# Altium footprint library MEBot.PcbLib: 161 footprints (part 6 of 11)
Each footprint in its own frame and in the unit in brackets; x right, y up, seen from the top. Pads: shape width x height; smd on the part's side, far side on the other; paste and mask are expansions set on the pad; w line width, h text height; cw(c..) or ccw(c..) is an arc to the next point about the centre after c.
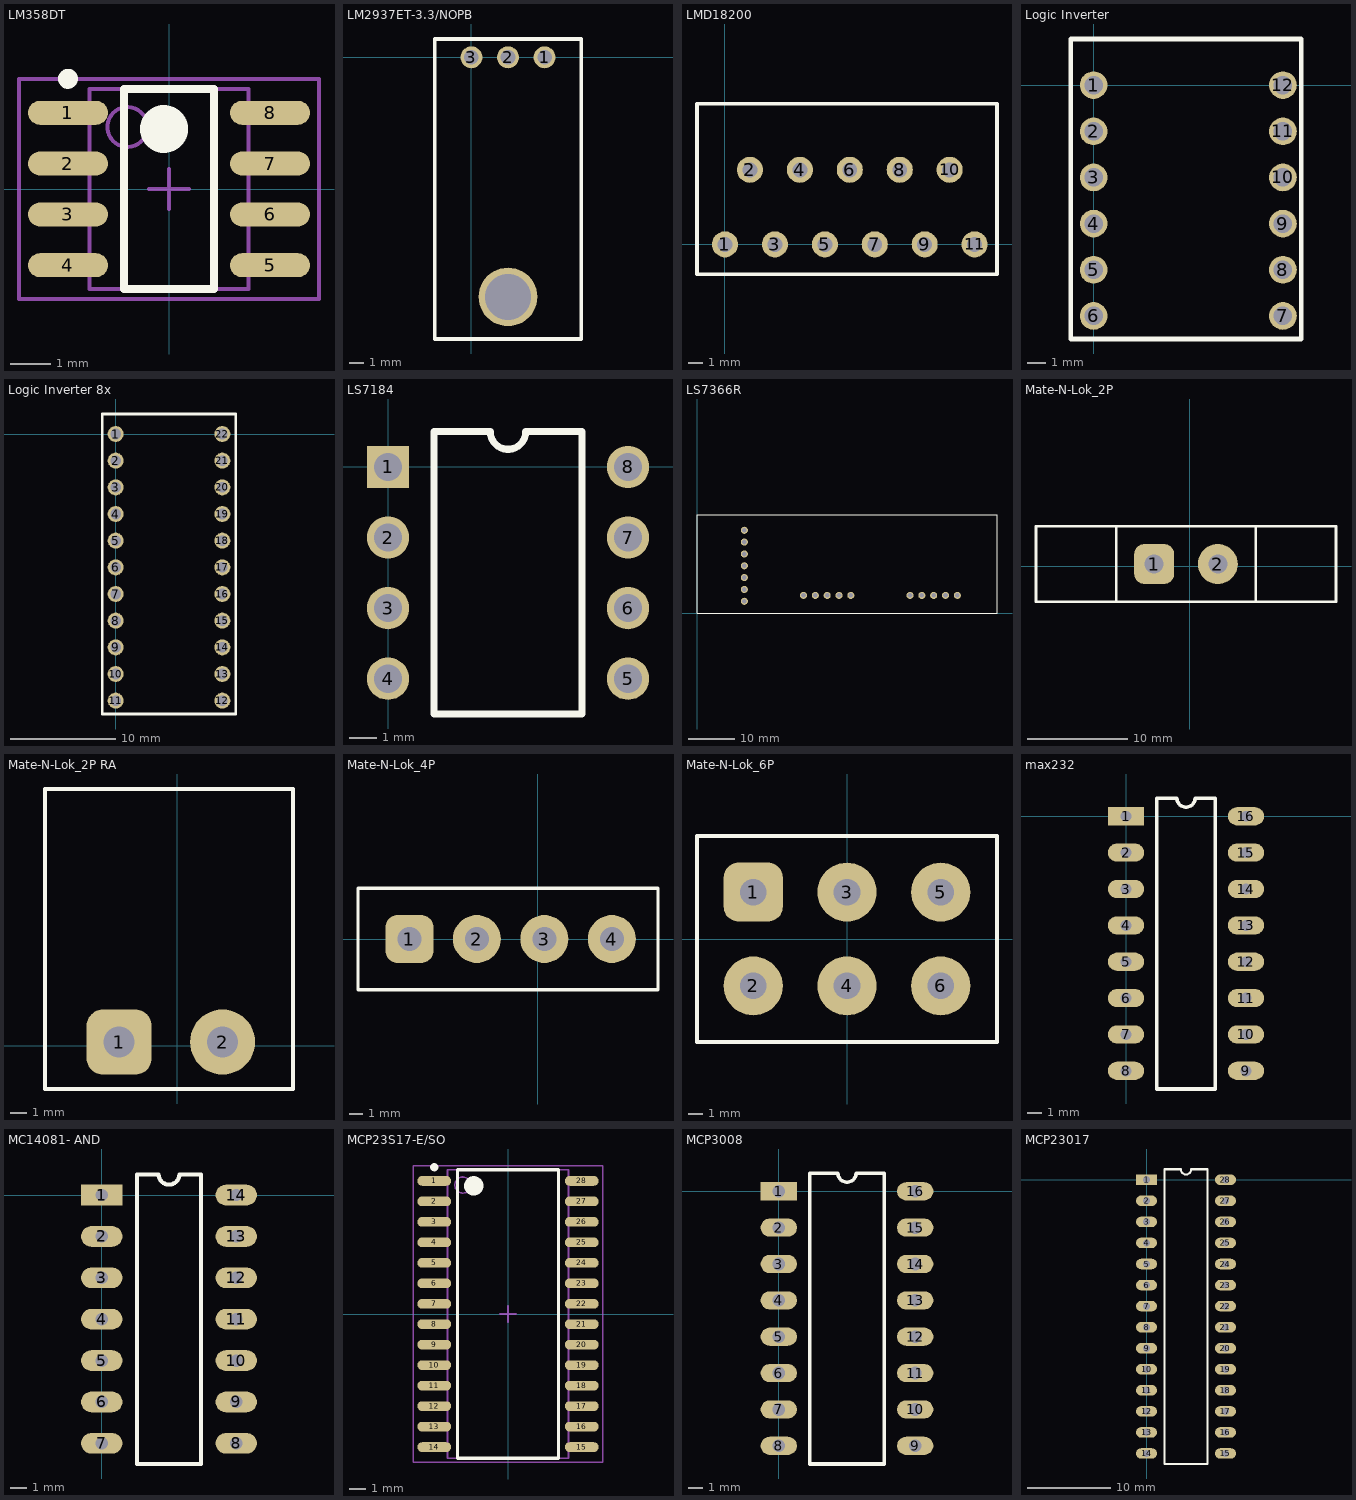
[diagram p5: the footprints below, top view; thin cyan lines are the x and y axes]

## LM358DT [mm] "SOIC, 8-Leads, Body 5.0x4.0mm (max), Pitch 1.27mm, IPC Medium Density"
height 1.75
pads (8):
  oval 2x0.6 smd: 1(-2.525,1.905) 2(-2.525,0.635) 3(-2.525,-0.635) 4(-2.525,-1.905) 5(2.525,-1.905) 6(2.525,-0.635) 7(2.525,0.635) 8(2.525,1.905)
Top Overlay:
  circle w0.25: c-2.525,2.755 r0.125
  circle w0.6: c-0.125,1.5 r0.3
  lines w0.2: -1.125,-2.5 -1.125,2.5 1.125,2.5 1.125,-2.5 -1.125,-2.5
Mechanical 13:
  circle w0.1: c-1.04,1.55 r0.5
  lines w0.1: -1.99,-2.5 -1.99,2.5 1.99,2.5 1.99,-2.5 -1.99,-2.5
Mechanical 15:
  lines w0.1: -0.5,0 0.5,0 ; 0,-0.5 0,0.5 ; -3.75,-2.75 -3.75,2.75 3.75,2.75 3.75,-2.75 -3.75,-2.75
3D body: height 1.75, standoff 0.01, extent -1.99,-2.5 1.99,2.5

## LM2937ET-3.3/NOPB [mil] "IC REG LINEAR 3.3V 500MA TO220-3"
pads (4):
  round 60 hole 40: 1(200,0) 2(100,0) 3(0,0)
  round 160 hole 125: ""(100,-655)
Top Overlay:
  lines w10: -100,-770 300,-770 300,50 -100,50 -100,-770
3D body "User Library-TO220 L.STEP": height 207.17, standoff -88.11, extent -96.85,-765.76 296.85,10

## LMD18200 [mil] "H BRIDGE 24v3A"
pads (11):
  round 70 hole 40: 1(0,0) 2(67,200) 3(134,0) 4(201,200) 5(268,0) 6(335,200) 7(402,0) 8(469,200) 9(536,0) 10(603,200) 11(670,0)
Top Overlay:
  lines w10: -75,-80 730,-80 730,377 -75,377 -75,-80
3D body "NDJ0011B.stp": height 830, standoff -146, extent -59,-10 729,367

## Logic Inverter [mil]
pads (12):
  round 60 hole 40: 1(0,0) 2(0,-100) 3(0,-200) 4(0,-300) 5(0,-400) 6(0,-500) 7(410,-500) 8(410,-400) 9(410,-300) 10(410,-200) 11(410,-100) 12(410,0)
Top Overlay:
  lines w10: -50,-550 -50,100 450,100 450,-550 -50,-550
3D body "Logic_Level_Bidirectional.STEP": height 0, standoff 0, extent 200,-250 200,-250

## Logic Inverter 8x [mil] "TXS01018E 8CHANNEL LEVEL SHIFTER"
pads (22):
  round 60 hole 40: 1(0,0) 2(0,-100) 3(0,-200) 4(0,-300) 5(0,-400) 6(0,-500) 7(0,-600) 8(0,-700) 9(0,-800) 10(0,-900) 11(0,-1000) 12(400,-1000) 13(400,-900) 14(400,-800) 15(400,-700) 16(400,-600) 17(400,-500) 18(400,-400) 19(400,-300) 20(400,-200) 21(400,-100) 22(400,0)
Top Overlay:
  lines w10: -50,-1050 -50,75 450,75 450,-1050 -50,-1050
3D body "Logic_Level_Bidirectional.STEP": height 0, standoff 0, extent 200,-250 200,-250

## LS7184 [mil]
pads (8):
  rect 60x60 hole 40: 1(0,0)
  round 60 hole 40: 2(0,-100) 3(0,-200) 4(0,-300) 5(340,-300) 6(340,-200) 7(340,-100) 8(340,0)
Top Overlay:
  lines w10: 65,-350 275,-350 275,50 195,50 cw(c170,50) 145,50 65,50 65,-350

## LS7366R [mil]
pads (17):
  round 60 hole 40: 1(400,100) 2(400,200) 3(400,300) 4(400,400) 5(400,500) 6(400,600) 7(400,700) 8(900,150) 9(1000,150) 10(1100,150) 11(1200,150) 12(1300,150) 13(1800,150) 14(1900,150) 15(2000,150) 16(2100,150) 17(2200,150)
Top Overlay:
  lines w10: 0,0 2535,0 2535,830 0,830 0,0
3D body "LS7366R.STEP": height 265, standoff 200, extent -2.5,0 2522.5,825

## Mate-N-Lok_2P [mm] "AMP Universal Mate-N-Lok vertical pin header (2 pin)"
height 31
pads (2):
  rrect50% 4x4 hole 1.9: 1(-3.569,0.216)
  round 4 hole 1.9: 2(2.781,0.216)
Top Overlay:
  lines w0.254: -7.379,-3.544 -7.379,3.976 ; 6.591,-3.544 6.591,3.976 ; -15.38,-3.544 14.592,-3.544 14.592,3.976 -15.38,3.976 -15.38,-3.544
3D body "c-0350786-01-r1-3d.stp": height 14.82, standoff -3.56, extent -9.919,-3.674 9.131,5.216

## Mate-N-Lok_2P RA [mm] "AMP Universal Mate-N-Lok vertical pin header (2 pin)"
height 31
pads (2):
  rrect50% 4x4 hole 1.9: 1(-3.569,0.216)
  round 4 hole 1.9: 2(2.781,0.216)
Top Overlay:
  lines w0.254: -8.128,-2.667 -8.128,15.748 7.112,15.748 7.112,-2.667 -8.128,-2.667

## Mate-N-Lok_4P [mil] "AMP Universal Mate-N-Lok vertical pin header (4 pin)"
height 1220.47
pads (4):
  rrect50% 140x140 hole 70: 1(-375,0)
  round 140 hole 70: 2(-178.15,0) 3(18.7,0) 4(215.55,0)
Top Overlay:
  lines w10: -524.8,-148.03 -524.8,148.03 350,148.03 350,-148.03 -524.8,-148.03

## Mate-N-Lok_6P [mm] "AMP Universal Mate-N-Lok vertical pin header (6 pin)"
height 31
pads (6):
  rrect50% 4x4 hole 1.8: 1(-6.35,3.175)
  round 4 hole 1.8: 2(-6.35,-3.175) 3(0,3.175) 4(0,-3.175) 5(6.35,3.175) 6(6.35,-3.175)
Top Overlay:
  lines w0.254: -10.16,-6.985 10.16,-6.985 10.16,6.985 -10.16,6.985 -10.16,-6.985
3D body "350762-4.STEP": height 15.07, standoff -3.3, extent -11.43,-9.525 11.43,9.525

## max232 [mil]
pads (16):
  rect 100x50 hole 30: 1(0,0)
  oval 100x50 hole 30: 2(0,-100) 3(0,-200) 4(0,-300) 5(0,-400) 6(0,-500) 7(0,-600) 8(0,-700) 9(330,-700) 10(330,-600) 11(330,-500) 12(330,-400) 13(330,-300) 14(330,-200) 15(330,-100) 16(330,0)
Top Overlay:
  lines w10: 85,-750 245,-750 245,50 190,50 cw(c165,50) 140,50 85,50 85,-750

## MC14081- AND [mil]
pads (14):
  rect 100x50 hole 30: 1(0,0)
  oval 100x50 hole 30: 2(0,-100) 3(0,-200) 4(0,-300) 5(0,-400) 6(0,-500) 7(0,-600) 8(325,-600) 9(325,-500) 10(325,-400) 11(325,-300) 12(325,-200) 13(325,-100) 14(325,0)
Top Overlay:
  lines w10: 85,-650 85,50 137.5,50 ccw(c162.5,50) 187.5,50 240,50 240,-650 85,-650

## MCP23S17-E/SO [mm] "IC I/O EXPANDER I2C 16B 28SOIC"
height 2.65
pads (28):
  oval 2.1x0.6 smd: 1(-4.575,8.255) 2(-4.575,6.985) 3(-4.575,5.715) 4(-4.575,4.445) 5(-4.575,3.175) 6(-4.575,1.905) 7(-4.575,0.635) 8(-4.575,-0.635) 9(-4.575,-1.905) 10(-4.575,-3.175) 11(-4.575,-4.445) 12(-4.575,-5.715) 13(-4.575,-6.985) 14(-4.575,-8.255) 15(4.575,-8.255) 16(4.575,-6.985) 17(4.575,-5.715) 18(4.575,-4.445) 19(4.575,-3.175) 20(4.575,-1.905) 21(4.575,-0.635) 22(4.575,0.635) 23(4.575,1.905) 24(4.575,3.175) 25(4.575,4.445) 26(4.575,5.715) 27(4.575,6.985) 28(4.575,8.255)
Top Overlay:
  circle w0.25: c-4.575,9.105 r0.125
  circle w0.6: c-2.125,7.95 r0.3
  lines w0.2: -3.125,-8.95 -3.125,8.95 3.125,8.95 3.125,-8.95 -3.125,-8.95
Mechanical 13:
  circle w0.1: c-2.8,8 r0.5
  lines w0.1: -3.75,-8.95 -3.75,8.95 3.75,8.95 3.75,-8.95 -3.75,-8.95
Mechanical 15:
  lines w0.1: -0.5,0 0.5,0 ; 0,-0.5 0,0.5 ; -5.875,-9.2 -5.875,9.2 5.875,9.2 5.875,-9.2 -5.875,-9.2
3D body: height 2.65, standoff 0.3, extent -3.75,-8.95 3.75,8.95

## MCP3008 [mil]
pads (16):
  rect 100x50 hole 35: 1(0,0)
  oval 100x50 hole 35: 2(0,-100) 3(0,-200) 4(0,-300) 5(0,-400) 6(0,-500) 7(0,-600) 8(0,-700) 9(375,-700) 10(375,-600) 11(375,-500) 12(375,-400) 13(375,-300) 14(375,-200) 15(375,-100) 16(375,0)
Top Overlay:
  lines w10: 85,-750 290,-750 290,50 212.5,50 cw(c187.5,50) 162.5,50 85,50 85,-750

## MCP23017 [mil]
pads (28):
  rect 100x50 hole 35: 1(0,0)
  oval 100x50 hole 35: 2(0,-100) 3(0,-200) 4(0,-300) 5(0,-400) 6(0,-500) 7(0,-600) 8(0,-700) 9(0,-800) 10(0,-900) 11(0,-1000) 12(0,-1100) 13(0,-1200) 14(0,-1300) 15(375,-1300) 16(375,-1200) 17(375,-1100) 18(375,-1000) 19(375,-900) 20(375,-800) 21(375,-700) 22(375,-600) 23(375,-500) 24(375,-400) 25(375,-300) 26(375,-200) 27(375,-100) 28(375,0)
Top Overlay:
  lines w10: 85,-1350 85,50 162.5,50 ccw(c187.5,50) 212.5,50 290,50 290,-1350 85,-1350